# Altium footprint library ST封装.PcbLib: 1336 footprints (part 88 of 109) (continued)
## SQFP36X36-344(T) [mm] (continued)
Top Overlay:
  lines w0.2: -18.9,-36.35 -18.9,-37.8 -17.45,-37.8 ; -18.9,-1.05 -18.9,-0.4 -18.1,0.4 -17.45,0.4 ; 17.85,-37.8 19.3,-37.8 19.3,-36.35 ; 17.85,0.4 19.3,0.4 19.3,-1.05

## SQFP36X36-352(N) [mm]
pads (352):
  rect 1.6x0.3 smd: 1(0,0)
  oval 1.6x0.3 smd: 2(0,-0.4) 3(0,-0.8) 4(0,-1.2) 5(0,-1.6) 6(0,-2) 7(0,-2.4) 8(0,-2.8) 9(0,-3.2) 10(0,-3.6) 11(0,-4) 12(0,-4.4) 13(0,-4.8) 14(0,-5.2) 15(0,-5.6) 16(0,-6) 17(0,-6.4) 18(0,-6.8) 19(0,-7.2) 20(0,-7.6) 21(0,-8) 22(0,-8.4) 23(0,-8.8) 24(0,-9.2) 25(0,-9.6) 26(0,-10) 27(0,-10.4) 28(0,-10.8) 29(0,-11.2) 30(0,-11.6) 31(0,-12) 32(0,-12.4) 33(0,-12.8) 34(0,-13.2) 35(0,-13.6) 36(0,-14) 37(0,-14.4) 38(0,-14.8) 39(0,-15.2) 40(0,-15.6) 41(0,-16) 42(0,-16.4) 43(0,-16.8) 44(0,-17.2) 45(0,-17.6) 46(0,-18) 47(0,-18.4) 48(0,-18.8) 49(0,-19.2) 50(0,-19.6) 51(0,-20) 52(0,-20.4) 53(0,-20.8) 54(0,-21.2) 55(0,-21.6) 56(0,-22) 57(0,-22.4) 58(0,-22.8) 59(0,-23.2) 60(0,-23.6) 61(0,-24) 62(0,-24.4) 63(0,-24.8) 64(0,-25.2) 65(0,-25.6) 66(0,-26) 67(0,-26.4) 68(0,-26.8) 69(0,-27.2) 70(0,-27.6) 71(0,-28) 72(0,-28.4) 73(0,-28.8) 74(0,-29.2) 75(0,-29.6) 76(0,-30) 77(0,-30.4) 78(0,-30.8) 79(0,-31.2) 80(0,-31.6) 81(0,-32) 82(0,-32.4) 83(0,-32.8) 84(0,-33.2) 85(0,-33.6) 86(0,-34) 87(0,-34.4) 88(0,-34.8) 177(37.4,-34.8) 178(37.4,-34.4) 179(37.4,-34) 180(37.4,-33.6) 181(37.4,-33.2) 182(37.4,-32.8) 183(37.4,-32.4) 184(37.4,-32) 185(37.4,-31.6) 186(37.4,-31.2) 187(37.4,-30.8) 188(37.4,-30.4) 189(37.4,-30) 190(37.4,-29.6) 191(37.4,-29.2) 192(37.4,-28.8) 193(37.4,-28.4) 194(37.4,-28) 195(37.4,-27.6) 196(37.4,-27.2) 197(37.4,-26.8) 198(37.4,-26.4) 199(37.4,-26) 200(37.4,-25.6) 201(37.4,-25.2) 202(37.4,-24.8) 203(37.4,-24.4) 204(37.4,-24) 205(37.4,-23.6) 206(37.4,-23.2) 207(37.4,-22.8) 208(37.4,-22.4) 209(37.4,-22) 210(37.4,-21.6) 211(37.4,-21.2) 212(37.4,-20.8) 213(37.4,-20.4) 214(37.4,-20) 215(37.4,-19.6) 216(37.4,-19.2) 217(37.4,-18.8) 218(37.4,-18.4) 219(37.4,-18) 220(37.4,-17.6) 221(37.4,-17.2) 222(37.4,-16.8) 223(37.4,-16.4) 224(37.4,-16) 225(37.4,-15.6) 226(37.4,-15.2) 227(37.4,-14.8) 228(37.4,-14.4) 229(37.4,-14) 230(37.4,-13.6) 231(37.4,-13.2) 232(37.4,-12.8) 233(37.4,-12.4) 234(37.4,-12) 235(37.4,-11.6) 236(37.4,-11.2) 237(37.4,-10.8) 238(37.4,-10.4) 239(37.4,-10) 240(37.4,-9.6) 241(37.4,-9.2) 242(37.4,-8.8) 243(37.4,-8.4) 244(37.4,-8) 245(37.4,-7.6) 246(37.4,-7.2) 247(37.4,-6.8) 248(37.4,-6.4) 249(37.4,-6) 250(37.4,-5.6) 251(37.4,-5.2) 252(37.4,-4.8) 253(37.4,-4.4) 254(37.4,-4) 255(37.4,-3.6) 256(37.4,-3.2) 257(37.4,-2.8) 258(37.4,-2.4) 259(37.4,-2) 260(37.4,-1.6) 261(37.4,-1.2) 262(37.4,-0.8) 263(37.4,-0.4) 264(37.4,0)
  oval 0.3x1.6 smd: 89(1.3,-36.1) 90(1.7,-36.1) 91(2.1,-36.1) 92(2.5,-36.1) 93(2.9,-36.1) 94(3.3,-36.1) 95(3.7,-36.1) 96(4.1,-36.1) 97(4.5,-36.1) 98(4.9,-36.1) 99(5.3,-36.1) 100(5.7,-36.1) 101(6.1,-36.1) 102(6.5,-36.1) 103(6.9,-36.1) 104(7.3,-36.1) 105(7.7,-36.1) 106(8.1,-36.1) 107(8.5,-36.1) 108(8.9,-36.1) 109(9.3,-36.1) 110(9.7,-36.1) 111(10.1,-36.1) 112(10.5,-36.1) 113(10.9,-36.1) 114(11.3,-36.1) 115(11.7,-36.1) 116(12.1,-36.1) 117(12.5,-36.1) 118(12.9,-36.1) 119(13.3,-36.1) 120(13.7,-36.1) 121(14.1,-36.1) 122(14.5,-36.1) 123(14.9,-36.1) 124(15.3,-36.1) 125(15.7,-36.1) 126(16.1,-36.1) 127(16.5,-36.1) 128(16.9,-36.1) 129(17.3,-36.1) 130(17.7,-36.1) 131(18.1,-36.1) 132(18.5,-36.1) 133(18.9,-36.1) 134(19.3,-36.1) 135(19.7,-36.1) 136(20.1,-36.1) 137(20.5,-36.1) 138(20.9,-36.1) 139(21.3,-36.1) 140(21.7,-36.1) 141(22.1,-36.1) 142(22.5,-36.1) 143(22.9,-36.1) 144(23.3,-36.1) 145(23.7,-36.1) 146(24.1,-36.1) 147(24.5,-36.1) 148(24.9,-36.1) 149(25.3,-36.1) 150(25.7,-36.1) 151(26.1,-36.1) 152(26.5,-36.1) 153(26.9,-36.1) 154(27.3,-36.1) 155(27.7,-36.1) 156(28.1,-36.1) 157(28.5,-36.1) 158(28.9,-36.1) 159(29.3,-36.1) 160(29.7,-36.1) 161(30.1,-36.1) 162(30.5,-36.1) 163(30.9,-36.1) 164(31.3,-36.1) 165(31.7,-36.1) 166(32.1,-36.1) 167(32.5,-36.1) 168(32.9,-36.1) 169(33.3,-36.1) 170(33.7,-36.1) 171(34.1,-36.1) 172(34.5,-36.1) 173(34.9,-36.1) 174(35.3,-36.1) 175(35.7,-36.1) 176(36.1,-36.1) 265(36.1,1.3) 266(35.7,1.3) 267(35.3,1.3) 268(34.9,1.3) 269(34.5,1.3) 270(34.1,1.3) 271(33.7,1.3) 272(33.3,1.3) 273(32.9,1.3) 274(32.5,1.3) 275(32.1,1.3) 276(31.7,1.3) 277(31.3,1.3) 278(30.9,1.3) 279(30.5,1.3) 280(30.1,1.3) 281(29.7,1.3) 282(29.3,1.3) 283(28.9,1.3) 284(28.5,1.3) 285(28.1,1.3) 286(27.7,1.3) 287(27.3,1.3) 288(26.9,1.3) 289(26.5,1.3) 290(26.1,1.3) 291(25.7,1.3) 292(25.3,1.3) 293(24.9,1.3) 294(24.5,1.3) 295(24.1,1.3) 296(23.7,1.3) 297(23.3,1.3) 298(22.9,1.3) 299(22.5,1.3) 300(22.1,1.3) 301(21.7,1.3) 302(21.3,1.3) 303(20.9,1.3) 304(20.5,1.3) 305(20.1,1.3) 306(19.7,1.3) 307(19.3,1.3) 308(18.9,1.3) 309(18.5,1.3) 310(18.1,1.3) 311(17.7,1.3) 312(17.3,1.3) 313(16.9,1.3) 314(16.5,1.3) 315(16.1,1.3) 316(15.7,1.3) 317(15.3,1.3) 318(14.9,1.3) 319(14.5,1.3) 320(14.1,1.3) 321(13.7,1.3) 322(13.3,1.3) 323(12.9,1.3) 324(12.5,1.3) 325(12.1,1.3) 326(11.7,1.3) 327(11.3,1.3) 328(10.9,1.3) 329(10.5,1.3) 330(10.1,1.3) 331(9.7,1.3) 332(9.3,1.3) 333(8.9,1.3) 334(8.5,1.3) 335(8.1,1.3) 336(7.7,1.3) 337(7.3,1.3) 338(6.9,1.3) 339(6.5,1.3) 340(6.1,1.3) 341(5.7,1.3) 342(5.3,1.3) 343(4.9,1.3) 344(4.5,1.3) 345(4.1,1.3) 346(3.7,1.3) 347(3.3,1.3) 348(2.9,1.3) 349(2.5,1.3) 350(2.1,1.3) 351(1.7,1.3) 352(1.3,1.3)
Top Overlay:
  lines w0.2: -0.4,-35.45 -0.4,-36.5 0.65,-36.5 ; -0.4,0.65 -0.4,0.9 0.4,1.7 0.65,1.7 ; 36.75,-36.5 37.8,-36.5 37.8,-35.45 ; 36.75,1.7 37.8,1.7 37.8,0.65

## SQFP36X36-352(T) [mm]
pads (352):
  rect 0.3x1.6 smd: 1(0,0)
  oval 0.3x1.6 smd: 2(-0.4,0) 3(-0.8,0) 4(-1.2,0) 5(-1.6,0) 6(-2,0) 7(-2.4,0) 8(-2.8,0) 9(-3.2,0) 10(-3.6,0) 11(-4,0) 12(-4.4,0) 13(-4.8,0) 14(-5.2,0) 15(-5.6,0) 16(-6,0) 17(-6.4,0) 18(-6.8,0) 19(-7.2,0) 20(-7.6,0) 21(-8,0) 22(-8.4,0) 23(-8.8,0) 24(-9.2,0) 25(-9.6,0) 26(-10,0) 27(-10.4,0) 28(-10.8,0) 29(-11.2,0) 30(-11.6,0) 31(-12,0) 32(-12.4,0) 33(-12.8,0) 34(-13.2,0) 35(-13.6,0) 36(-14,0) 37(-14.4,0) 38(-14.8,0) 39(-15.2,0) 40(-15.6,0) 41(-16,0) 42(-16.4,0) 43(-16.8,0) 44(-17.2,0) 133(-17.2,-37.4) 134(-16.8,-37.4) 135(-16.4,-37.4) 136(-16,-37.4) 137(-15.6,-37.4) 138(-15.2,-37.4) 139(-14.8,-37.4) 140(-14.4,-37.4) 141(-14,-37.4) 142(-13.6,-37.4) 143(-13.2,-37.4) 144(-12.8,-37.4) 145(-12.4,-37.4) 146(-12,-37.4) 147(-11.6,-37.4) 148(-11.2,-37.4) 149(-10.8,-37.4) 150(-10.4,-37.4) 151(-10,-37.4) 152(-9.6,-37.4) 153(-9.2,-37.4) 154(-8.8,-37.4) 155(-8.4,-37.4) 156(-8,-37.4) 157(-7.6,-37.4) 158(-7.2,-37.4) 159(-6.8,-37.4) 160(-6.4,-37.4) 161(-6,-37.4) 162(-5.6,-37.4) 163(-5.2,-37.4) 164(-4.8,-37.4) 165(-4.4,-37.4) 166(-4,-37.4) 167(-3.6,-37.4) 168(-3.2,-37.4) 169(-2.8,-37.4) 170(-2.4,-37.4) 171(-2,-37.4) 172(-1.6,-37.4) 173(-1.2,-37.4) 174(-0.8,-37.4) 175(-0.4,-37.4) 176(0,-37.4) 177(0.4,-37.4) 178(0.8,-37.4) 179(1.2,-37.4) 180(1.6,-37.4) 181(2,-37.4) 182(2.4,-37.4) 183(2.8,-37.4) 184(3.2,-37.4) 185(3.6,-37.4) 186(4,-37.4) 187(4.4,-37.4) 188(4.8,-37.4) 189(5.2,-37.4) 190(5.6,-37.4) 191(6,-37.4) 192(6.4,-37.4) 193(6.8,-37.4) 194(7.2,-37.4) 195(7.6,-37.4) 196(8,-37.4) 197(8.4,-37.4) 198(8.8,-37.4) 199(9.2,-37.4) 200(9.6,-37.4) 201(10,-37.4) 202(10.4,-37.4) 203(10.8,-37.4) 204(11.2,-37.4) 205(11.6,-37.4) 206(12,-37.4) 207(12.4,-37.4) 208(12.8,-37.4) 209(13.2,-37.4) 210(13.6,-37.4) 211(14,-37.4) 212(14.4,-37.4) 213(14.8,-37.4) 214(15.2,-37.4) 215(15.6,-37.4) 216(16,-37.4) 217(16.4,-37.4) 218(16.8,-37.4) 219(17.2,-37.4) 220(17.6,-37.4) 309(17.6,0) 310(17.2,0) 311(16.8,0) 312(16.4,0) 313(16,0) 314(15.6,0) 315(15.2,0) 316(14.8,0) 317(14.4,0) 318(14,0) 319(13.6,0) 320(13.2,0) 321(12.8,0) 322(12.4,0) 323(12,0) 324(11.6,0) 325(11.2,0) 326(10.8,0) 327(10.4,0) 328(10,0) 329(9.6,0) 330(9.2,0) 331(8.8,0) 332(8.4,0) 333(8,0) 334(7.6,0) 335(7.2,0) 336(6.8,0) 337(6.4,0) 338(6,0) 339(5.6,0) 340(5.2,0) 341(4.8,0) 342(4.4,0) 343(4,0) 344(3.6,0) 345(3.2,0) 346(2.8,0) 347(2.4,0) 348(2,0) 349(1.6,0) 350(1.2,0) 351(0.8,0) 352(0.4,0)
  oval 1.6x0.3 smd: 45(-18.5,-1.3) 46(-18.5,-1.7) 47(-18.5,-2.1) 48(-18.5,-2.5) 49(-18.5,-2.9) 50(-18.5,-3.3) 51(-18.5,-3.7) 52(-18.5,-4.1) 53(-18.5,-4.5) 54(-18.5,-4.9) 55(-18.5,-5.3) 56(-18.5,-5.7) 57(-18.5,-6.1) 58(-18.5,-6.5) 59(-18.5,-6.9) 60(-18.5,-7.3) 61(-18.5,-7.7) 62(-18.5,-8.1) 63(-18.5,-8.5) 64(-18.5,-8.9) 65(-18.5,-9.3) 66(-18.5,-9.7) 67(-18.5,-10.1) 68(-18.5,-10.5) 69(-18.5,-10.9) 70(-18.5,-11.3) 71(-18.5,-11.7) 72(-18.5,-12.1) 73(-18.5,-12.5) 74(-18.5,-12.9) 75(-18.5,-13.3) 76(-18.5,-13.7) 77(-18.5,-14.1) 78(-18.5,-14.5) 79(-18.5,-14.9) 80(-18.5,-15.3) 81(-18.5,-15.7) 82(-18.5,-16.1) 83(-18.5,-16.5) 84(-18.5,-16.9) 85(-18.5,-17.3) 86(-18.5,-17.7) 87(-18.5,-18.1) 88(-18.5,-18.5) 89(-18.5,-18.9) 90(-18.5,-19.3) 91(-18.5,-19.7) 92(-18.5,-20.1) 93(-18.5,-20.5) 94(-18.5,-20.9) 95(-18.5,-21.3) 96(-18.5,-21.7) 97(-18.5,-22.1) 98(-18.5,-22.5) 99(-18.5,-22.9) 100(-18.5,-23.3) 101(-18.5,-23.7) 102(-18.5,-24.1) 103(-18.5,-24.5) 104(-18.5,-24.9) 105(-18.5,-25.3) 106(-18.5,-25.7) 107(-18.5,-26.1) 108(-18.5,-26.5) 109(-18.5,-26.9) 110(-18.5,-27.3) 111(-18.5,-27.7) 112(-18.5,-28.1) 113(-18.5,-28.5) 114(-18.5,-28.9) 115(-18.5,-29.3) 116(-18.5,-29.7) 117(-18.5,-30.1) 118(-18.5,-30.5) 119(-18.5,-30.9) 120(-18.5,-31.3) 121(-18.5,-31.7) 122(-18.5,-32.1) 123(-18.5,-32.5) 124(-18.5,-32.9) 125(-18.5,-33.3) 126(-18.5,-33.7) 127(-18.5,-34.1) 128(-18.5,-34.5) 129(-18.5,-34.9) 130(-18.5,-35.3) 131(-18.5,-35.7) 132(-18.5,-36.1) 221(18.9,-36.1) 222(18.9,-35.7) 223(18.9,-35.3) 224(18.9,-34.9) 225(18.9,-34.5) 226(18.9,-34.1) 227(18.9,-33.7) 228(18.9,-33.3) 229(18.9,-32.9) 230(18.9,-32.5) 231(18.9,-32.1) 232(18.9,-31.7) 233(18.9,-31.3) 234(18.9,-30.9) 235(18.9,-30.5) 236(18.9,-30.1) 237(18.9,-29.7) 238(18.9,-29.3) 239(18.9,-28.9) 240(18.9,-28.5) 241(18.9,-28.1) 242(18.9,-27.7) 243(18.9,-27.3) 244(18.9,-26.9) 245(18.9,-26.5) 246(18.9,-26.1) 247(18.9,-25.7) 248(18.9,-25.3) 249(18.9,-24.9) 250(18.9,-24.5) 251(18.9,-24.1) 252(18.9,-23.7) 253(18.9,-23.3) 254(18.9,-22.9) 255(18.9,-22.5) 256(18.9,-22.1) 257(18.9,-21.7) 258(18.9,-21.3) 259(18.9,-20.9) 260(18.9,-20.5) 261(18.9,-20.1) 262(18.9,-19.7) 263(18.9,-19.3) 264(18.9,-18.9) 265(18.9,-18.5) 266(18.9,-18.1) 267(18.9,-17.7) 268(18.9,-17.3) 269(18.9,-16.9) 270(18.9,-16.5) 271(18.9,-16.1) 272(18.9,-15.7) 273(18.9,-15.3) 274(18.9,-14.9) 275(18.9,-14.5) 276(18.9,-14.1) 277(18.9,-13.7) 278(18.9,-13.3) 279(18.9,-12.9) 280(18.9,-12.5) 281(18.9,-12.1) 282(18.9,-11.7) 283(18.9,-11.3) 284(18.9,-10.9) 285(18.9,-10.5) 286(18.9,-10.1) 287(18.9,-9.7) 288(18.9,-9.3) 289(18.9,-8.9) 290(18.9,-8.5) 291(18.9,-8.1) 292(18.9,-7.7) 293(18.9,-7.3) 294(18.9,-6.9) 295(18.9,-6.5) 296(18.9,-6.1) 297(18.9,-5.7) 298(18.9,-5.3) 299(18.9,-4.9) 300(18.9,-4.5) 301(18.9,-4.1) 302(18.9,-3.7) 303(18.9,-3.3) 304(18.9,-2.9) 305(18.9,-2.5) 306(18.9,-2.1) 307(18.9,-1.7) 308(18.9,-1.3)
Top Overlay:
  lines w0.2: -18.9,-36.75 -18.9,-37.8 -17.85,-37.8 ; -18.9,-0.65 -18.9,-0.4 -18.1,0.4 -17.85,0.4 ; 18.25,-37.8 19.3,-37.8 19.3,-36.75 ; 18.25,0.4 19.3,0.4 19.3,-0.65

## SQFP36X36-456(N) [mm]
pads (456):
  rect 1.6x0.2 smd: 1(0,0)
  oval 1.6x0.2 smd: 2(0,-0.3) 3(0,-0.6) 4(0,-0.9) 5(0,-1.2) 6(0,-1.5) 7(0,-1.8) 8(0,-2.1) 9(0,-2.4) 10(0,-2.7) 11(0,-3) 12(0,-3.3) 13(0,-3.6) 14(0,-3.9) 15(0,-4.2) 16(0,-4.5) 17(0,-4.8) 18(0,-5.1) 19(0,-5.4) 20(0,-5.7) 21(0,-6) 22(0,-6.3) 23(0,-6.6) 24(0,-6.9) 25(0,-7.2) 26(0,-7.5) 27(0,-7.8) 28(0,-8.1) 29(0,-8.4) 30(0,-8.7) 31(0,-9) 32(0,-9.3) 33(0,-9.6) 34(0,-9.9) 35(0,-10.2) 36(0,-10.5) 37(0,-10.8) 38(0,-11.1) 39(0,-11.4) 40(0,-11.7) 41(0,-12) 42(0,-12.3) 43(0,-12.6) 44(0,-12.9) 45(0,-13.2) 46(0,-13.5) 47(0,-13.8) 48(0,-14.1) 49(0,-14.4) 50(0,-14.7) 51(0,-15) 52(0,-15.3) 53(0,-15.6) 54(0,-15.9) 55(0,-16.2) 56(0,-16.5) 57(0,-16.8) 58(0,-17.1) 59(0,-17.4) 60(0,-17.7) 61(0,-18) 62(0,-18.3) 63(0,-18.6) 64(0,-18.9) 65(0,-19.2) 66(0,-19.5) 67(0,-19.8) 68(0,-20.1) 69(0,-20.4) 70(0,-20.7) 71(0,-21) 72(0,-21.3) 73(0,-21.6) 74(0,-21.9) 75(0,-22.2) 76(0,-22.5) 77(0,-22.8) 78(0,-23.1) 79(0,-23.4) 80(0,-23.7) 81(0,-24) 82(0,-24.3) 83(0,-24.6) 84(0,-24.9) 85(0,-25.2) 86(0,-25.5) 87(0,-25.8) 88(0,-26.1) 89(0,-26.4) 90(0,-26.7) 91(0,-27) 92(0,-27.3) 93(0,-27.6) 94(0,-27.9) 95(0,-28.2) 96(0,-28.5) 97(0,-28.8) 98(0,-29.1) 99(0,-29.4) 100(0,-29.7) 101(0,-30) 102(0,-30.3) 103(0,-30.6) 104(0,-30.9) 105(0,-31.2) 106(0,-31.5) 107(0,-31.8) 108(0,-32.1) 109(0,-32.4) 110(0,-32.7) 111(0,-33) 112(0,-33.3) 113(0,-33.6) 114(0,-33.9) 229(37.4,-33.9) 230(37.4,-33.6) 231(37.4,-33.3) 232(37.4,-33) 233(37.4,-32.7) 234(37.4,-32.4) 235(37.4,-32.1) 236(37.4,-31.8) 237(37.4,-31.5) 238(37.4,-31.2) 239(37.4,-30.9) 240(37.4,-30.6) 241(37.4,-30.3) 242(37.4,-30) 243(37.4,-29.7) 244(37.4,-29.4) 245(37.4,-29.1) 246(37.4,-28.8) 247(37.4,-28.5) 248(37.4,-28.2) 249(37.4,-27.9) 250(37.4,-27.6) 251(37.4,-27.3) 252(37.4,-27) 253(37.4,-26.7) 254(37.4,-26.4) 255(37.4,-26.1) 256(37.4,-25.8) 257(37.4,-25.5) 258(37.4,-25.2) 259(37.4,-24.9) 260(37.4,-24.6) 261(37.4,-24.3) 262(37.4,-24) 263(37.4,-23.7) 264(37.4,-23.4) 265(37.4,-23.1) 266(37.4,-22.8) 267(37.4,-22.5) 268(37.4,-22.2) 269(37.4,-21.9) 270(37.4,-21.6) 271(37.4,-21.3) 272(37.4,-21) 273(37.4,-20.7) 274(37.4,-20.4) 275(37.4,-20.1) 276(37.4,-19.8) 277(37.4,-19.5) 278(37.4,-19.2) 279(37.4,-18.9) 280(37.4,-18.6) 281(37.4,-18.3) 282(37.4,-18) 283(37.4,-17.7) 284(37.4,-17.4) 285(37.4,-17.1) 286(37.4,-16.8) 287(37.4,-16.5) 288(37.4,-16.2) 289(37.4,-15.9) 290(37.4,-15.6) 291(37.4,-15.3) 292(37.4,-15) 293(37.4,-14.7) 294(37.4,-14.4) 295(37.4,-14.1) 296(37.4,-13.8) 297(37.4,-13.5) 298(37.4,-13.2) 299(37.4,-12.9) 300(37.4,-12.6) 301(37.4,-12.3) 302(37.4,-12) 303(37.4,-11.7) 304(37.4,-11.4) 305(37.4,-11.1) 306(37.4,-10.8) 307(37.4,-10.5) 308(37.4,-10.2) 309(37.4,-9.9) 310(37.4,-9.6) 311(37.4,-9.3) 312(37.4,-9) 313(37.4,-8.7) 314(37.4,-8.4) 315(37.4,-8.1) 316(37.4,-7.8) 317(37.4,-7.5) 318(37.4,-7.2) 319(37.4,-6.9) 320(37.4,-6.6) 321(37.4,-6.3) 322(37.4,-6) 323(37.4,-5.7) 324(37.4,-5.4) 325(37.4,-5.1) 326(37.4,-4.8) 327(37.4,-4.5) 328(37.4,-4.2) 329(37.4,-3.9) 330(37.4,-3.6) 331(37.4,-3.3) 332(37.4,-3) 333(37.4,-2.7) 334(37.4,-2.4) 335(37.4,-2.1) 336(37.4,-1.8) 337(37.4,-1.5) 338(37.4,-1.2) 339(37.4,-0.9) 340(37.4,-0.6) 341(37.4,-0.3) 342(37.4,0)
  oval 0.2x1.6 smd: 115(1.75,-35.65) 116(2.05,-35.65) 117(2.35,-35.65) 118(2.65,-35.65) 119(2.95,-35.65) 120(3.25,-35.65) 121(3.55,-35.65) 122(3.85,-35.65) 123(4.15,-35.65) 124(4.45,-35.65) 125(4.75,-35.65) 126(5.05,-35.65) 127(5.35,-35.65) 128(5.65,-35.65) 129(5.95,-35.65) 130(6.25,-35.65) 131(6.55,-35.65) 132(6.85,-35.65) 133(7.15,-35.65) 134(7.45,-35.65) 135(7.75,-35.65) 136(8.05,-35.65) 137(8.35,-35.65) 138(8.65,-35.65) 139(8.95,-35.65) 140(9.25,-35.65) 141(9.55,-35.65) 142(9.85,-35.65) 143(10.15,-35.65) 144(10.45,-35.65) 145(10.75,-35.65) 146(11.05,-35.65) 147(11.35,-35.65) 148(11.65,-35.65) 149(11.95,-35.65) 150(12.25,-35.65) 151(12.55,-35.65) 152(12.85,-35.65) 153(13.15,-35.65) 154(13.45,-35.65) 155(13.75,-35.65) 156(14.05,-35.65) 157(14.35,-35.65) 158(14.65,-35.65) 159(14.95,-35.65) 160(15.25,-35.65) 161(15.55,-35.65) 162(15.85,-35.65) 163(16.15,-35.65) 164(16.45,-35.65) 165(16.75,-35.65) 166(17.05,-35.65) 167(17.35,-35.65) 168(17.65,-35.65) 169(17.95,-35.65) 170(18.25,-35.65) 171(18.55,-35.65) 172(18.85,-35.65) 173(19.15,-35.65) 174(19.45,-35.65) 175(19.75,-35.65) 176(20.05,-35.65) 177(20.35,-35.65) 178(20.65,-35.65) 179(20.95,-35.65) 180(21.25,-35.65) 181(21.55,-35.65) 182(21.85,-35.65) 183(22.15,-35.65) 184(22.45,-35.65) 185(22.75,-35.65) 186(23.05,-35.65) 187(23.35,-35.65) 188(23.65,-35.65) 189(23.95,-35.65) 190(24.25,-35.65) 191(24.55,-35.65) 192(24.85,-35.65) 193(25.15,-35.65) 194(25.45,-35.65) 195(25.75,-35.65) 196(26.05,-35.65) 197(26.35,-35.65) 198(26.65,-35.65) 199(26.95,-35.65) 200(27.25,-35.65) 201(27.55,-35.65) 202(27.85,-35.65) 203(28.15,-35.65) 204(28.45,-35.65) 205(28.75,-35.65) 206(29.05,-35.65) 207(29.35,-35.65) 208(29.65,-35.65) 209(29.95,-35.65) 210(30.25,-35.65) 211(30.55,-35.65) 212(30.85,-35.65) 213(31.15,-35.65) 214(31.45,-35.65) 215(31.75,-35.65) 216(32.05,-35.65) 217(32.35,-35.65) 218(32.65,-35.65) 219(32.95,-35.65) 220(33.25,-35.65) 221(33.55,-35.65) 222(33.85,-35.65) 223(34.15,-35.65) 224(34.45,-35.65) 225(34.75,-35.65) 226(35.05,-35.65) 227(35.35,-35.65) 228(35.65,-35.65) 343(35.65,1.75) 344(35.35,1.75) 345(35.05,1.75) 346(34.75,1.75) 347(34.45,1.75) 348(34.15,1.75) 349(33.85,1.75) 350(33.55,1.75) 351(33.25,1.75) 352(32.95,1.75) 353(32.65,1.75) 354(32.35,1.75) 355(32.05,1.75) 356(31.75,1.75) 357(31.45,1.75) 358(31.15,1.75) 359(30.85,1.75) 360(30.55,1.75) 361(30.25,1.75) 362(29.95,1.75) 363(29.65,1.75) 364(29.35,1.75) 365(29.05,1.75) 366(28.75,1.75) 367(28.45,1.75) 368(28.15,1.75) 369(27.85,1.75) 370(27.55,1.75) 371(27.25,1.75) 372(26.95,1.75) 373(26.65,1.75) 374(26.35,1.75) 375(26.05,1.75) 376(25.75,1.75) 377(25.45,1.75) 378(25.15,1.75) 379(24.85,1.75) 380(24.55,1.75) 381(24.25,1.75) 382(23.95,1.75) 383(23.65,1.75) 384(23.35,1.75) 385(23.05,1.75) 386(22.75,1.75) 387(22.45,1.75) 388(22.15,1.75) 389(21.85,1.75) 390(21.55,1.75) 391(21.25,1.75) 392(20.95,1.75) 393(20.65,1.75) 394(20.35,1.75) 395(20.05,1.75) 396(19.75,1.75) 397(19.45,1.75) 398(19.15,1.75) 399(18.85,1.75) 400(18.55,1.75) 401(18.25,1.75) 402(17.95,1.75) 403(17.65,1.75) 404(17.35,1.75) 405(17.05,1.75) 406(16.75,1.75) 407(16.45,1.75) 408(16.15,1.75) 409(15.85,1.75) 410(15.55,1.75) 411(15.25,1.75) 412(14.95,1.75) 413(14.65,1.75) 414(14.35,1.75) 415(14.05,1.75) 416(13.75,1.75) 417(13.45,1.75) 418(13.15,1.75) 419(12.85,1.75) 420(12.55,1.75) 421(12.25,1.75) 422(11.95,1.75) 423(11.65,1.75) 424(11.35,1.75) 425(11.05,1.75) 426(10.75,1.75) 427(10.45,1.75) 428(10.15,1.75) 429(9.85,1.75) 430(9.55,1.75) 431(9.25,1.75) 432(8.95,1.75) 433(8.65,1.75) 434(8.35,1.75) 435(8.05,1.75) 436(7.75,1.75) 437(7.45,1.75) 438(7.15,1.75) 439(6.85,1.75) 440(6.55,1.75) 441(6.25,1.75) 442(5.95,1.75) 443(5.65,1.75) 444(5.35,1.75) 445(5.05,1.75) 446(4.75,1.75) 447(4.45,1.75) 448(4.15,1.75) 449(3.85,1.75) 450(3.55,1.75) 451(3.25,1.75) 452(2.95,1.75) 453(2.65,1.75) 454(2.35,1.75) 455(2.05,1.75) 456(1.75,1.75)
Top Overlay:
  lines w0.2: -0.4,-34.5 -0.4,-36.05 1.15,-36.05 ; -0.4,0.6 -0.4,1.35 0.4,2.15 1.15,2.15 ; 36.25,-36.05 37.8,-36.05 37.8,-34.5 ; 36.25,2.15 37.8,2.15 37.8,0.6

## SQFP36X36-456(T) [mm]
pads (456):
  rect 0.2x1.6 smd: 1(0,0)
  oval 0.2x1.6 smd: 2(-0.3,0) 3(-0.6,0) 4(-0.9,0) 5(-1.2,0) 6(-1.5,0) 7(-1.8,0) 8(-2.1,0) 9(-2.4,0) 10(-2.7,0) 11(-3,0) 12(-3.3,0) 13(-3.6,0) 14(-3.9,0) 15(-4.2,0) 16(-4.5,0) 17(-4.8,0) 18(-5.1,0) 19(-5.4,0) 20(-5.7,0) 21(-6,0) 22(-6.3,0) 23(-6.6,0) 24(-6.9,0) 25(-7.2,0) 26(-7.5,0) 27(-7.8,0) 28(-8.1,0) 29(-8.4,0) 30(-8.7,0) 31(-9,0) 32(-9.3,0) 33(-9.6,0) 34(-9.9,0) 35(-10.2,0) 36(-10.5,0) 37(-10.8,0) 38(-11.1,0) 39(-11.4,0) 40(-11.7,0) 41(-12,0) 42(-12.3,0) 43(-12.6,0) 44(-12.9,0) 45(-13.2,0) 46(-13.5,0) 47(-13.8,0) 48(-14.1,0) 49(-14.4,0) 50(-14.7,0) 51(-15,0) 52(-15.3,0) 53(-15.6,0) 54(-15.9,0) 55(-16.2,0) 56(-16.5,0) 57(-16.8,0) 172(-16.8,-37.4) 173(-16.5,-37.4) 174(-16.2,-37.4) 175(-15.9,-37.4) 176(-15.6,-37.4) 177(-15.3,-37.4) 178(-15,-37.4) 179(-14.7,-37.4) 180(-14.4,-37.4) 181(-14.1,-37.4) 182(-13.8,-37.4) 183(-13.5,-37.4) 184(-13.2,-37.4) 185(-12.9,-37.4) 186(-12.6,-37.4) 187(-12.3,-37.4) 188(-12,-37.4) 189(-11.7,-37.4) 190(-11.4,-37.4) 191(-11.1,-37.4) 192(-10.8,-37.4) 193(-10.5,-37.4) 194(-10.2,-37.4) 195(-9.9,-37.4) 196(-9.6,-37.4) 197(-9.3,-37.4) 198(-9,-37.4) 199(-8.7,-37.4) 200(-8.4,-37.4) 201(-8.1,-37.4) 202(-7.8,-37.4) 203(-7.5,-37.4) 204(-7.2,-37.4) 205(-6.9,-37.4) 206(-6.6,-37.4) 207(-6.3,-37.4) 208(-6,-37.4) 209(-5.7,-37.4) 210(-5.4,-37.4) 211(-5.1,-37.4) 212(-4.8,-37.4) 213(-4.5,-37.4) 214(-4.2,-37.4) 215(-3.9,-37.4) 216(-3.6,-37.4) 217(-3.3,-37.4) 218(-3,-37.4) 219(-2.7,-37.4) 220(-2.4,-37.4) 221(-2.1,-37.4) 222(-1.8,-37.4) 223(-1.5,-37.4) 224(-1.2,-37.4) 225(-0.9,-37.4) 226(-0.6,-37.4) 227(-0.3,-37.4) 228(0,-37.4) 229(0.3,-37.4) 230(0.6,-37.4) 231(0.9,-37.4) 232(1.2,-37.4) 233(1.5,-37.4) 234(1.8,-37.4) 235(2.1,-37.4) 236(2.4,-37.4) 237(2.7,-37.4) 238(3,-37.4) 239(3.3,-37.4) 240(3.6,-37.4) 241(3.9,-37.4) 242(4.2,-37.4) 243(4.5,-37.4) 244(4.8,-37.4) 245(5.1,-37.4) 246(5.4,-37.4) 247(5.7,-37.4) 248(6,-37.4) 249(6.3,-37.4) 250(6.6,-37.4) 251(6.9,-37.4) 252(7.2,-37.4) 253(7.5,-37.4) 254(7.8,-37.4) 255(8.1,-37.4) 256(8.4,-37.4) 257(8.7,-37.4) 258(9,-37.4) 259(9.3,-37.4) 260(9.6,-37.4) 261(9.9,-37.4) 262(10.2,-37.4) 263(10.5,-37.4) 264(10.8,-37.4) 265(11.1,-37.4) 266(11.4,-37.4) 267(11.7,-37.4) 268(12,-37.4) 269(12.3,-37.4) 270(12.6,-37.4) 271(12.9,-37.4) 272(13.2,-37.4) 273(13.5,-37.4) 274(13.8,-37.4) 275(14.1,-37.4) 276(14.4,-37.4) 277(14.7,-37.4) 278(15,-37.4) 279(15.3,-37.4) 280(15.6,-37.4) 281(15.9,-37.4) 282(16.2,-37.4) 283(16.5,-37.4) 284(16.8,-37.4) 285(17.1,-37.4) 400(17.1,0) 401(16.8,0) 402(16.5,0) 403(16.2,0) 404(15.9,0) 405(15.6,0) 406(15.3,0) 407(15,0) 408(14.7,0) 409(14.4,0) 410(14.1,0) 411(13.8,0) 412(13.5,0) 413(13.2,0) 414(12.9,0) 415(12.6,0) 416(12.3,0) 417(12,0) 418(11.7,0) 419(11.4,0) 420(11.1,0) 421(10.8,0) 422(10.5,0) 423(10.2,0) 424(9.9,0) 425(9.6,0) 426(9.3,0) 427(9,0) 428(8.7,0) 429(8.4,0) 430(8.1,0) 431(7.8,0) 432(7.5,0) 433(7.2,0) 434(6.9,0) 435(6.6,0) 436(6.3,0) 437(6,0) 438(5.7,0) 439(5.4,0) 440(5.1,0) 441(4.8,0) 442(4.5,0) 443(4.2,0) 444(3.9,0) 445(3.6,0) 446(3.3,0) 447(3,0) 448(2.7,0) 449(2.4,0) 450(2.1,0) 451(1.8,0) 452(1.5,0) 453(1.2,0) 454(0.9,0) 455(0.6,0) 456(0.3,0)
  oval 1.6x0.2 smd: 58(-18.55,-1.75) 59(-18.55,-2.05) 60(-18.55,-2.35) 61(-18.55,-2.65) 62(-18.55,-2.95) 63(-18.55,-3.25) 64(-18.55,-3.55) 65(-18.55,-3.85) 66(-18.55,-4.15) 67(-18.55,-4.45) 68(-18.55,-4.75) 69(-18.55,-5.05) 70(-18.55,-5.35) 71(-18.55,-5.65) 72(-18.55,-5.95) 73(-18.55,-6.25) 74(-18.55,-6.55) 75(-18.55,-6.85) 76(-18.55,-7.15) 77(-18.55,-7.45) 78(-18.55,-7.75) 79(-18.55,-8.05) 80(-18.55,-8.35) 81(-18.55,-8.65) 82(-18.55,-8.95) 83(-18.55,-9.25) 84(-18.55,-9.55) 85(-18.55,-9.85) 86(-18.55,-10.15) 87(-18.55,-10.45) 88(-18.55,-10.75) 89(-18.55,-11.05) 90(-18.55,-11.35) 91(-18.55,-11.65) 92(-18.55,-11.95) 93(-18.55,-12.25) 94(-18.55,-12.55) 95(-18.55,-12.85) 96(-18.55,-13.15) 97(-18.55,-13.45) 98(-18.55,-13.75) 99(-18.55,-14.05) 100(-18.55,-14.35) 101(-18.55,-14.65) 102(-18.55,-14.95) 103(-18.55,-15.25) 104(-18.55,-15.55) 105(-18.55,-15.85) 106(-18.55,-16.15) 107(-18.55,-16.45) 108(-18.55,-16.75) 109(-18.55,-17.05) 110(-18.55,-17.35) 111(-18.55,-17.65) 112(-18.55,-17.95) 113(-18.55,-18.25) 114(-18.55,-18.55) 115(-18.55,-18.85) 116(-18.55,-19.15) 117(-18.55,-19.45) 118(-18.55,-19.75) 119(-18.55,-20.05) 120(-18.55,-20.35) 121(-18.55,-20.65) 122(-18.55,-20.95) 123(-18.55,-21.25) 124(-18.55,-21.55) 125(-18.55,-21.85) 126(-18.55,-22.15) 127(-18.55,-22.45) 128(-18.55,-22.75) 129(-18.55,-23.05) 130(-18.55,-23.35) 131(-18.55,-23.65) 132(-18.55,-23.95) 133(-18.55,-24.25) 134(-18.55,-24.55) 135(-18.55,-24.85) 136(-18.55,-25.15) 137(-18.55,-25.45) 138(-18.55,-25.75) 139(-18.55,-26.05) 140(-18.55,-26.35) 141(-18.55,-26.65) 142(-18.55,-26.95) 143(-18.55,-27.25) 144(-18.55,-27.55) 145(-18.55,-27.85) 146(-18.55,-28.15) 147(-18.55,-28.45) 148(-18.55,-28.75) 149(-18.55,-29.05) 150(-18.55,-29.35) 151(-18.55,-29.65) 152(-18.55,-29.95) 153(-18.55,-30.25) 154(-18.55,-30.55) 155(-18.55,-30.85) 156(-18.55,-31.15) 157(-18.55,-31.45) 158(-18.55,-31.75) 159(-18.55,-32.05) 160(-18.55,-32.35) 161(-18.55,-32.65) 162(-18.55,-32.95) 163(-18.55,-33.25) 164(-18.55,-33.55) 165(-18.55,-33.85) 166(-18.55,-34.15) 167(-18.55,-34.45) 168(-18.55,-34.75) 169(-18.55,-35.05) 170(-18.55,-35.35) 171(-18.55,-35.65) 286(18.85,-35.65) 287(18.85,-35.35) 288(18.85,-35.05) 289(18.85,-34.75) 290(18.85,-34.45) 291(18.85,-34.15) 292(18.85,-33.85) 293(18.85,-33.55) 294(18.85,-33.25) 295(18.85,-32.95) 296(18.85,-32.65) 297(18.85,-32.35) 298(18.85,-32.05) 299(18.85,-31.75) 300(18.85,-31.45) 301(18.85,-31.15) 302(18.85,-30.85) 303(18.85,-30.55) 304(18.85,-30.25) 305(18.85,-29.95) 306(18.85,-29.65) 307(18.85,-29.35) 308(18.85,-29.05) 309(18.85,-28.75) 310(18.85,-28.45) 311(18.85,-28.15) 312(18.85,-27.85) 313(18.85,-27.55) 314(18.85,-27.25) 315(18.85,-26.95) 316(18.85,-26.65) 317(18.85,-26.35) 318(18.85,-26.05) 319(18.85,-25.75) 320(18.85,-25.45) 321(18.85,-25.15) 322(18.85,-24.85) 323(18.85,-24.55) 324(18.85,-24.25) 325(18.85,-23.95) 326(18.85,-23.65) 327(18.85,-23.35) 328(18.85,-23.05) 329(18.85,-22.75) 330(18.85,-22.45) 331(18.85,-22.15) 332(18.85,-21.85) 333(18.85,-21.55) 334(18.85,-21.25) 335(18.85,-20.95) 336(18.85,-20.65) 337(18.85,-20.35) 338(18.85,-20.05) 339(18.85,-19.75) 340(18.85,-19.45) 341(18.85,-19.15) 342(18.85,-18.85) 343(18.85,-18.55) 344(18.85,-18.25) 345(18.85,-17.95) 346(18.85,-17.65) 347(18.85,-17.35) 348(18.85,-17.05) 349(18.85,-16.75) 350(18.85,-16.45) 351(18.85,-16.15) 352(18.85,-15.85) 353(18.85,-15.55) 354(18.85,-15.25) 355(18.85,-14.95) 356(18.85,-14.65) 357(18.85,-14.35) 358(18.85,-14.05) 359(18.85,-13.75) 360(18.85,-13.45) 361(18.85,-13.15) 362(18.85,-12.85) 363(18.85,-12.55) 364(18.85,-12.25) 365(18.85,-11.95) 366(18.85,-11.65) 367(18.85,-11.35) 368(18.85,-11.05) 369(18.85,-10.75) 370(18.85,-10.45) 371(18.85,-10.15) 372(18.85,-9.85) 373(18.85,-9.55) 374(18.85,-9.25) 375(18.85,-8.95) 376(18.85,-8.65) 377(18.85,-8.35) 378(18.85,-8.05) 379(18.85,-7.75) 380(18.85,-7.45) 381(18.85,-7.15) 382(18.85,-6.85) 383(18.85,-6.55) 384(18.85,-6.25) 385(18.85,-5.95) 386(18.85,-5.65) 387(18.85,-5.35) 388(18.85,-5.05) 389(18.85,-4.75) 390(18.85,-4.45) 391(18.85,-4.15) 392(18.85,-3.85) 393(18.85,-3.55) 394(18.85,-3.25) 395(18.85,-2.95) 396(18.85,-2.65) 397(18.85,-2.35) 398(18.85,-2.05) 399(18.85,-1.75)
Top Overlay:
  lines w0.2: -18.95,-36.25 -18.95,-37.8 -17.4,-37.8 ; -18.95,-1.15 -18.95,-0.4 -18.15,0.4 -17.4,0.4 ; 17.7,-37.8 19.25,-37.8 19.25,-36.25 ; 17.7,0.4 19.25,0.4 19.25,-1.15